# Altium footprint library Power_Lib_Altium.PcbLib: 383 footprints (part 11 of 24)
Each footprint in its own frame and in the unit in brackets; x right, y up, seen from the top. Pads: shape width x height; smd on the part's side, far side on the other; paste and mask are expansions set on the pad; w line width, h text height; cw(c..) or ccw(c..) is an arc to the next point about the centre after c.
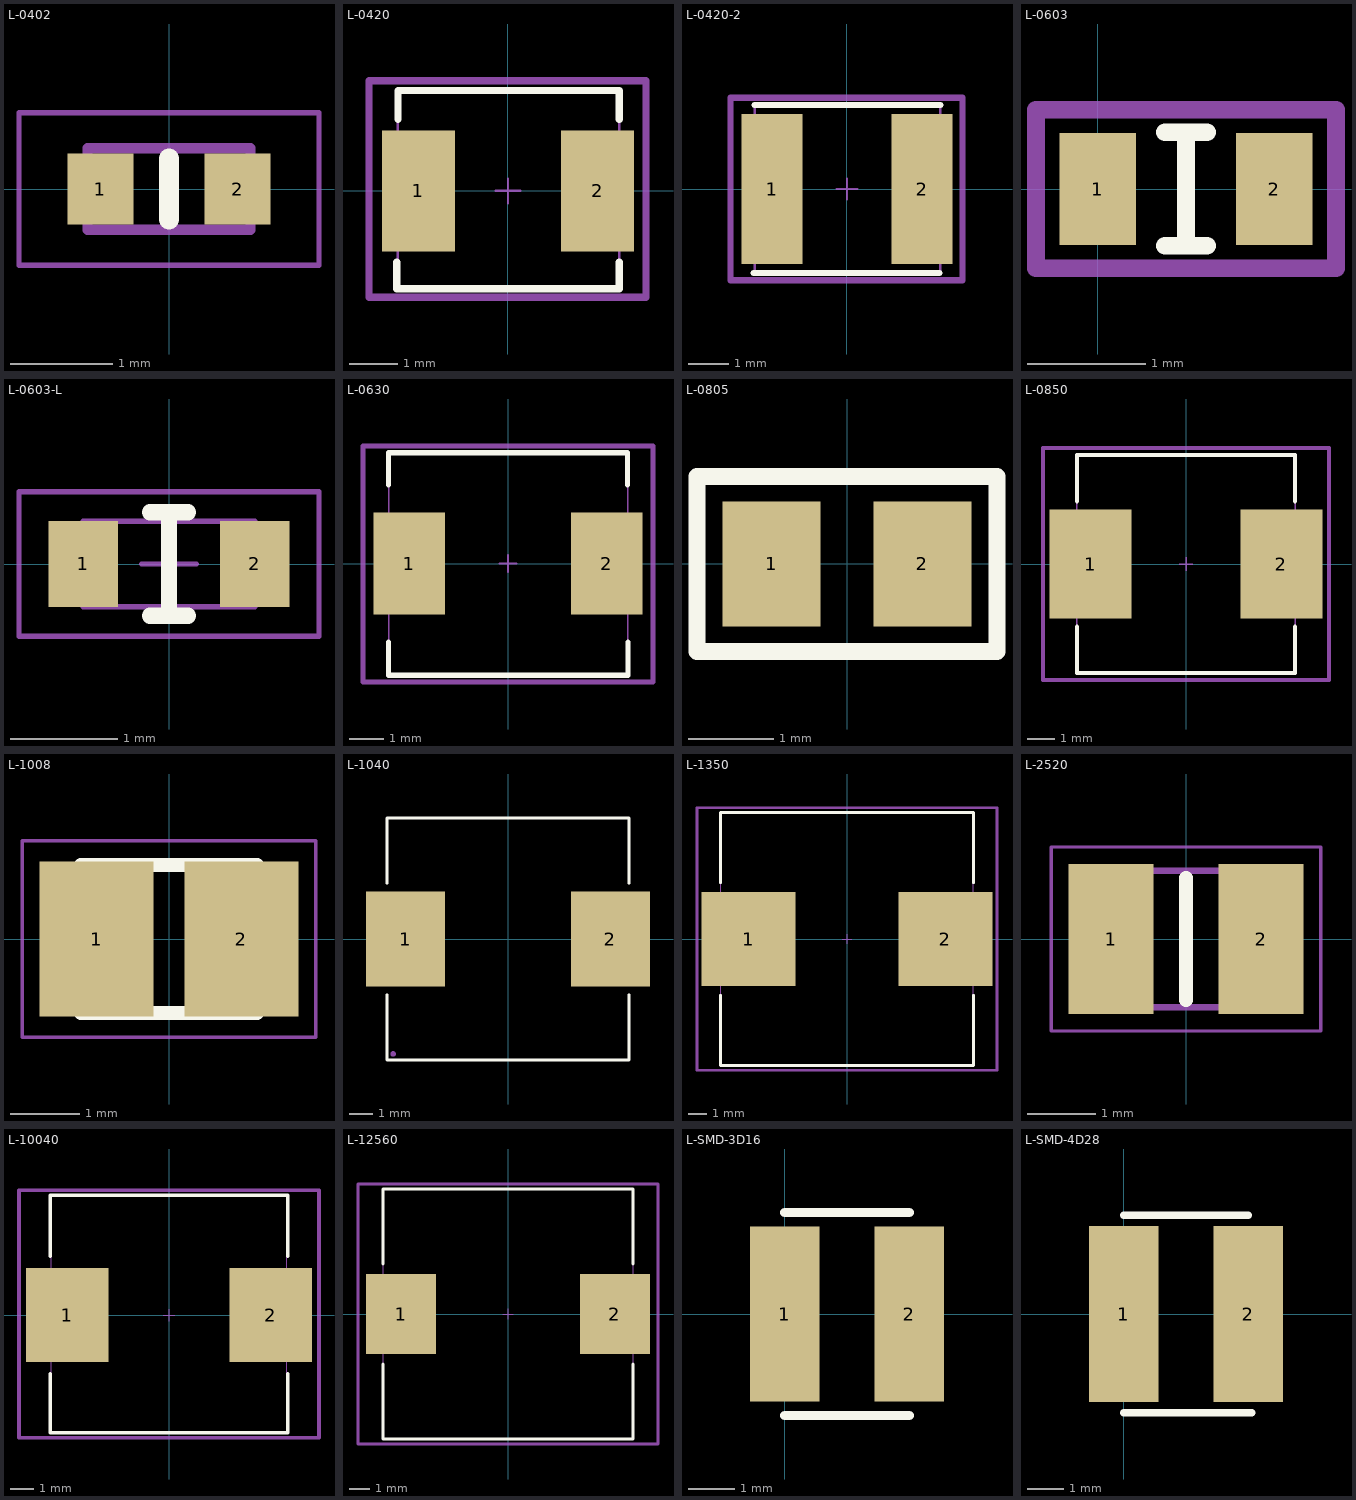
[diagram p10: the footprints below, top view; thin cyan lines are the x and y axes]

## L-0402 [mm]
pads (2):
  rect 0.65x0.7 smd: 1(-0.675,0) 2(0.675,0)
Top Overlay:
  lines w0.2: 0,-0.3 0,0.3
Mechanical 13:
  lines w0.1: -0.8,-0.4 -0.8,0.4 0.8,0.4 0.8,-0.4 -0.8,-0.4
Mechanical 15:
  lines w0.05: -1.475,-0.75 1.475,-0.75 1.475,0.75 -1.475,0.75 -1.475,-0.75
3D body "BLM18KG221SN1D.stp": height 1.05, standoff 0, extent -0.935,-0.4 0.935,0.4

## L-0420 [mm] "4.1*4.6*2MM(长*宽*高)"
pads (2):
  rect 1.5x2.5 smd: 1(-1.85,0) 2(1.85,0)
Top Overlay:
  lines w0.15: -2.3,-1.475 -2.3,-2.025 -1.775,-2.025 1.75,-2.025 2.3,-2.025 2.3,-1.475 ; -2.275,1.475 -2.275,2.075 -1.675,2.075 1.675,2.075 2.3,2.075 ; 2.3,1.475 2.3,2.075 ; 2.3,2.075 2.3,2.075
Mechanical 13:
  lines w0.051: -0.254,0 0.254,0 ; 0,-0.254 0,0.254 ; -2.275,-2.025 2.3,-2.025 2.3,2.075 -2.275,2.075 -2.275,-2.025
Mechanical 14:
  lines w0.15: -2.875,-2.2 2.85,-2.2 2.85,2.275 -2.875,2.275 -2.875,-2.2
3D body: height 2, standoff 0, extent -2.275,-2.025 2.3,2.075

## L-0420-2 [mm] "4.1*4.6*2MM(长*宽*高)"
pads (2):
  rect 1.5x3.7 smd: 1(-1.85,0) 2(1.85,0)
Top Overlay:
  lines w0.15: -2.3,-2.075 2.275,-2.075 ; -2.275,2.075 2.3,2.075 ; 2.3,2.075 2.3,2.075
Mechanical 13:
  lines w0.051: -0.254,0 0.254,0 ; 0,-0.254 0,0.254 ; -2.275,-2.025 -2.275,2.075 2.3,2.075 2.3,-2.025 -2.275,-2.025
Mechanical 14:
  lines w0.15: -2.875,-2.25 -2.875,2.25 2.85,2.25 2.85,-2.25 -2.875,-2.25
3D body: height 2, standoff 0, extent -2.275,-2.025 2.3,2.075

## L-0603 [mm]
height 0.35
pads (2):
  rect 0.65x0.95 smd: 1(0,0) 2(1.5,0)
Top Overlay:
  lines w0.152: 0.572,-0.483 0.928,-0.483 ; 0.572,0.483 0.928,0.483 ; 0.75,-0.483 0.75,0.483
Mechanical 15:
  lines w0.15: -0.525,-0.675 2.025,-0.675 2.025,0.675 -0.525,0.675 -0.525,-0.675
3D body "0603-res.step": height 0.35, standoff 0, extent -0.125,-0.475 1.625,0.475

## L-0603-L [mm]
height 0.35
pads (2):
  rect 0.65x0.8 smd: 1(-0.8,0) 2(0.8,0)
Top Overlay:
  lines w0.152: -0.178,-0.483 0.178,-0.483 ; -0.178,0.483 0.178,0.483 ; 0,-0.483 0,0.483
Mechanical 13:
  lines w0.051: -0.254,0 0.254,0 ; 0,-0.254 0,0.254 ; -0.8,-0.4 -0.8,0.4 0.8,0.4 0.8,-0.4 -0.8,-0.4
Mechanical 14:
  lines w0.051: -1.4,-0.675 -1.4,0.675 1.4,0.675 1.4,-0.675 -1.4,-0.675
3D body "RESC1608X05L.step": height 0.45, standoff 0, extent -0.8,-0.4 0.8,0.4

## L-0630 [mm] "7*6.6*2.8MM(长*宽*高)"
pads (2):
  rect 2.1x3 smd: 1(-2.9,0) 2(2.9,0)
Top Overlay:
  lines w0.15: -3.5,-2.3 -3.5,-3.275 3.525,-3.275 3.525,-2.3 ; -3.5,2.3 -3.5,3.25 3.5,3.25 3.5,2.3
Mechanical 13:
  lines w0.051: -0.254,0 0.254,0 ; 0,-0.254 0,0.254 ; -3.5,-3.25 3.512,-3.25 3.512,3.238 3.5,3.25 -3.5,3.25 -3.5,-3.25
Mechanical 14:
  lines w0.15: -4.25,-3.475 4.25,-3.475 4.25,3.45 -4.25,3.45 -4.25,-3.475
3D body: height 2.8, standoff 0, extent -3.5,-3.25 3.525,3.25

## L-0805 [mm]
pads (2):
  rect 1.16x1.47 smd: 1(-0.89,0) 2(0.89,0)
Top Overlay:
  lines w0.2: -1.77,-1.035 1.77,-1.035 1.77,1.035 -1.77,1.035 -1.77,-1.035
3D body "L0805.STEP": height 0.6, standoff -0.02, extent -1.022,-0.637 1.028,0.638

## L-0850 [mm] "7.8*7.5*5.0MM(长*宽*高)"
pads (2):
  rect 3x4 smd: 1(-3.5,0) 2(3.5,0)
Top Overlay:
  lines w0.15: -4,-2.3 -4,-4 4,-4 4,-2.3 ; -4,2.3 -4,4 4,4 4,2.3
Mechanical 13:
  lines w0.051: -0.254,0 0.254,0 ; 0,-0.254 0,0.254 ; -4,-4 4,-4 4,4 -4,4 -4,-4
Mechanical 14:
  lines w0.15: -5.25,-4.25 -5.25,4.25 5.25,4.25 5.25,-4.25 -5.25,-4.25
3D body: height 3, standoff 0, extent -4,-4 4,4

## L-1008 [mm]
pads (2):
  rect 1.65x2.25 smd: 1(-1.05,0) 2(1.05,0)
Top Overlay:
  lines w0.2: -1.275,-1.075 1.275,-1.075 ; -1.275,1.075 1.275,1.075
Mechanical 13:
  lines w0.1: -1.275,-1.075 1.275,-1.075 1.275,1.075 -1.275,1.075 -1.275,-1.075
Mechanical 15:
  lines w0.05: -2.125,-1.425 2.125,-1.425 2.125,1.425 -2.125,1.425 -2.125,-1.425
3D body "SRN2512-2R2M.stp": height 1.2, standoff 0, extent -1.275,-1.075 1.275,1.075

## L-1040 [mm]
pads (2):
  rect 3.4x4.1 smd: 1(-4.4,0) 2(4.4,0)
Top Overlay:
  lines w0.12: -5.199,-2.4 -5.199,-5.199 5.199,-5.199 5.199,-2.4 ; -5.199,2.4 -5.199,5.199 5.199,5.199 5.199,2.4
Mechanical 5:
  region: 3.4,1.5 5.575,1.5 5.575,-1.5 3.4,-1.5
  region: -5.575,1.5 -3.4,1.5 -3.4,-1.5 -5.575,-1.5
Mechanical 6:
  circle w0.12: c-4.94,-4.94 r0.06
3D body: height 3, standoff 0, extent -5.207,-5.207 5.207,5.207

## L-1350 [mm] "13.45*12.6*5.0MM(长*宽*高)"
pads (2):
  rect 5x5 smd: 1(-5.25,0) 2(5.25,0)
Top Overlay:
  lines w0.15: -6.75,-3 -6.75,-6.75 6.75,-6.75 6.75,-3 ; -6.75,3 -6.75,6.75 6.75,6.75 6.75,3
Mechanical 13:
  lines w0.051: -0.254,0 0.254,0 ; 0,-0.254 0,0.254 ; -6.725,-6.725 6.725,-6.725 6.725,6.725 -6.725,6.725 -6.725,-6.725
Mechanical 14:
  lines w0.15: -8,-7 8,-7 8,7 -8,7 -8,-7
3D body: height 5, standoff 0, extent -6.75,-6.725 6.725,6.725

## L-2520 [mm]
pads (2):
  rect 1.25x2.2 smd: 1(-1.1,0) 2(1.1,0)
Top Overlay:
  lines w0.2: 0,-0.9 0,0.9
Mechanical 13:
  lines w0.1: -1.25,-1 -1.25,1 1.25,1 1.25,-1 -1.25,-1
Mechanical 15:
  lines w0.05: -1.975,-1.35 -1.975,1.35 1.975,1.35 1.975,-1.35 -1.975,-1.35
3D body "LQM2HPN2R2MG0L.stp": height 1, standoff 0, extent -1.25,-1 1.25,1

## L-10040 [mm] "10.1*11.6*4.0MM(长*宽*高)"
pads (2):
  rect 3.5x4 smd: 1(-4.326,0) 2(4.326,0)
Top Overlay:
  lines w0.15: -5.051,-2.5 -5.051,-5 5.049,-5 5.049,-2.5 ; -5.051,2.5 -5.051,5.1 5.049,5.1 5.049,2.5
Mechanical 13:
  lines w0.051: -0.254,0 0.254,0 ; 0,-0.254 0,0.254 ; -5,-5 5,-5 5,5.075 -5,5.075 -5,-5
Mechanical 14:
  lines w0.15: -6.375,-5.2 6.375,-5.2 6.375,5.3 -6.375,5.3 -6.375,-5.2
3D body: height 4, standoff 0, extent -5,-5 5,5.075

## L-12560 [mm] "12.5*12.8*6.0MM(长*宽*高)"
pads (2):
  rect 3.5x4 smd: 1(-5.35,0) 2(5.35,0)
Top Overlay:
  lines w0.15: -6.25,-2.5 -6.25,-6.25 6.25,-6.25 6.25,-2.5 ; -6.25,2.5 -6.25,6.25 6.25,6.25 6.25,2.5
Mechanical 13:
  lines w0.051: -0.254,0 0.254,0 ; 0,-0.254 0,0.254 ; -6.25,-6.25 6.25,-6.25 6.25,6.25 -6.25,6.25 -6.25,-6.25
Mechanical 14:
  lines w0.15: -7.5,-6.5 7.5,-6.5 7.5,6.5 -7.5,6.5 -7.5,-6.5
3D body: height 6, standoff 0, extent -6.25,-6.25 6.25,6.25

## L-SMD-3D16 [mm] "贴片电感4x4"
pads (2):
  rect 1.5x3.8 smd: 1(0,0) 2(2.7,0)
Top Overlay:
  lines w0.2: 0,-2.2 2.7,-2.2 ; 0,2.2 2.7,2.2
3D body: height 2, standoff 0, extent -0.5,-1.85 3.2,1.85

## L-SMD-4D28 [mm] "贴片电感5x5"
pads (2):
  rect 1.9x4.8 smd: 1(0,0) 2(3.4,0)
Top Overlay:
  lines w0.2: 0,-2.7 3.5,-2.7 ; 0,2.7 3.4,2.7
3D body "CDRH4D28.STEP": height 2.91, standoff 0, extent -0.75,-2.45 4.15,2.45